# Altium footprint library 1.01-电阻.PcbLib: 82 footprints (part 3 of 6)
Each footprint in its own frame and in the unit in brackets; x right, y up, seen from the top. Pads: shape width x height; smd on the part's side, far side on the other; paste and mask are expansions set on the pad; w line width, h text height; cw(c..) or ccw(c..) is an arc to the next point about the centre after c.
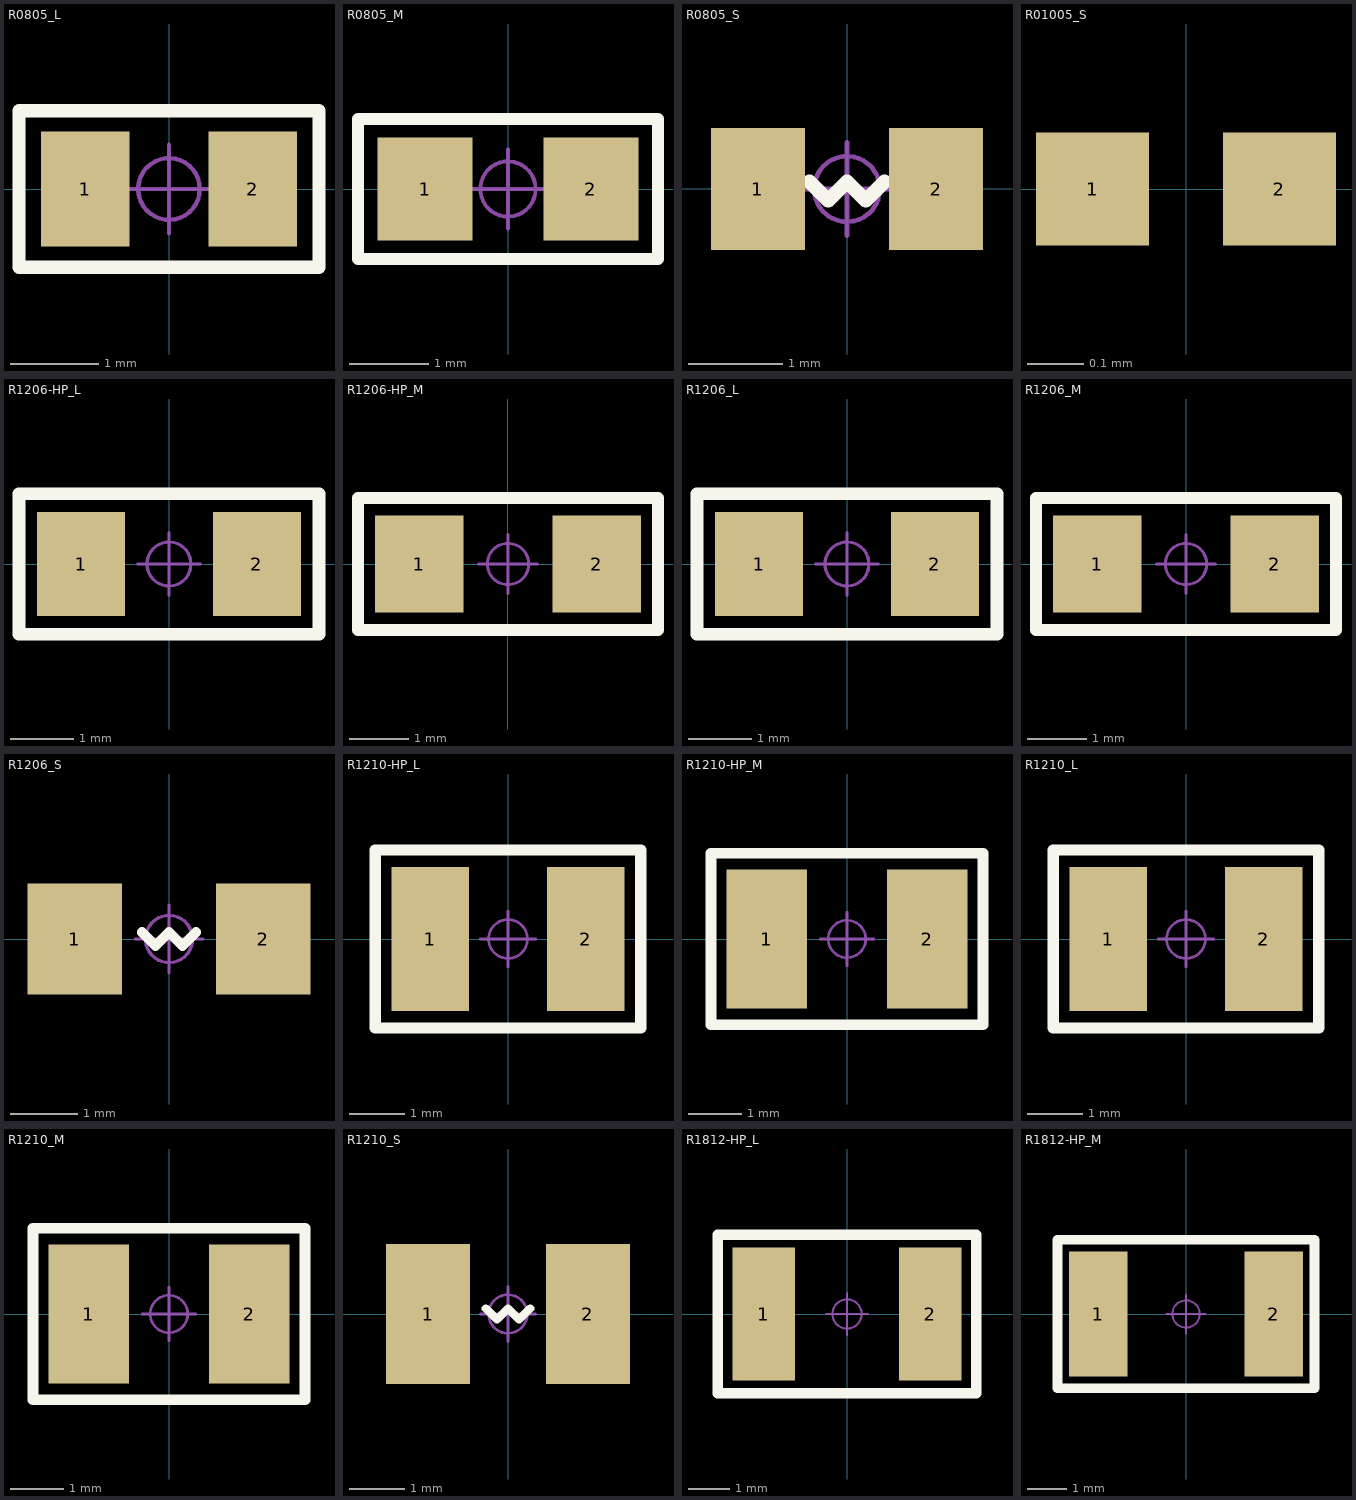
[diagram p2: the footprints below, top view; thin cyan lines are the x and y axes]

## R0805_L [mm] "1/8W贴片电阻"
pads (2):
  rect 1x1.3 smd: 1(-0.95,0) 2(0.95,0)
Top Overlay:
  lines w0.152: -1.702,-0.889 1.702,-0.889 1.702,0.889 -1.702,0.889 -1.702,-0.889
Mechanical 15:
  circle w0.05: c0,0 r0.35
  lines w0.05: -0.5,0 0.5,0 ; 0,-0.5 0,0.5
3D body: height 0.5, standoff 0, extent -1,-0.625 1,0.625

## R0805_M [mm] "1/8W贴片电阻"
pads (2):
  rect 1.2x1.3 smd: 1(-1.05,0) 2(1.05,0)
Top Overlay:
  lines w0.152: -1.9,-0.889 -1.9,0.889 1.9,0.889 1.9,-0.889 -1.9,-0.889
Mechanical 15:
  circle w0.05: c0,0 r0.35
  lines w0.05: -0.5,0 0.5,0 ; 0,-0.5 0,0.5
3D body: height 0.5, standoff 0, extent -1,-0.625 1,0.625

## R0805_S [mm] "1/8W贴片电阻-无丝印      联系卖家 免费人工查找封装"
pads (2):
  rect 1x1.3 smd: 1(-0.95,0) 2(0.95,0)
Top Overlay:
  lines w0.152: -0.4,0.076 -0.2,-0.124 0,0.076 0.2,-0.124 0.4,0.076
Mechanical 15:
  circle w0.05: c0,0 r0.35
  lines w0.05: -0.5,0 0.5,0 ; 0,-0.5 0,0.5
3D body: height 0.5, standoff 0, extent -1,-0.625 1,0.625

## R01005_S [mm] "1/32W贴片电阻-无丝印"
pads (2):
  rect 0.2x0.2 smd paste+0 mask+0: 1(-0.165,0) 2(0.165,0)
3D body: height 0.13, standoff 0, extent -0.199,-0.1 0.199,0.1

## R1206-HP_L [mm] "1/4W高精度贴片电阻"
pads (2):
  rect 1.4x1.65 smd: 1(-1.4,0.006) 2(1.4,0.006)
Top Overlay:
  lines w0.203: -2.388,-1.112 2.388,-1.112 2.388,1.124 -2.388,1.124 -2.388,-1.112
Mechanical 15:
  circle w0.05: c0,0.006 r0.35
  lines w0.05: -0.5,0.006 0.5,0.006 ; 0,-0.494 0,0.506
3D body: height 0.56, standoff 0, extent -1.6,-0.794 1.6,0.806

## R1206-HP_M [mm] "1/4W高精度贴片电阻"
pads (2):
  rect 1.5x1.65 smd: 1(-1.5,0) 2(1.5,0)
Top Overlay:
  lines w0.203: -2.54,-1.118 -2.54,1.118 2.54,1.118 2.54,-1.118 -2.54,-1.118
Mechanical 15:
  circle w0.05: c0,0 r0.35
  lines w0.05: -0.5,0 0.5,0 ; 0,-0.5 0,0.5
3D body: height 0.56, standoff 0, extent -1.6,-0.8 1.6,0.8

## R1206_L [mm] "1/4W贴片电阻"
pads (2):
  rect 1.4x1.65 smd: 1(-1.4,0) 2(1.4,0)
Top Overlay:
  lines w0.203: -2.388,-1.118 2.388,-1.118 2.388,1.118 -2.388,1.118 -2.388,-1.118
Mechanical 15:
  circle w0.05: c0,0 r0.35
  lines w0.05: -0.5,0 0.5,0 ; 0,-0.5 0,0.5
3D body: height 0.56, standoff 0, extent -1.6,-0.8 1.6,0.8

## R1206_M [mm] "1/4W贴片电阻"
pads (2):
  rect 1.5x1.65 smd: 1(-1.5,0) 2(1.5,0)
Top Overlay:
  lines w0.203: -2.54,-1.118 -2.54,1.118 2.54,1.118 2.54,-1.118 -2.54,-1.118
Mechanical 15:
  circle w0.05: c0,0 r0.35
  lines w0.05: -0.5,0 0.5,0 ; 0,-0.5 0,0.5
3D body: height 0.56, standoff 0, extent -1.6,-0.8 1.6,0.8

## R1206_S [mm] "1/4W贴片电阻-无丝印      联系卖家 免费人工查找封装"
pads (2):
  rect 1.4x1.65 smd: 1(-1.4,0) 2(1.4,0)
Top Overlay:
  lines w0.152: -0.4,0.1 -0.2,-0.1 0,0.1 0.2,-0.1 0.4,0.1
Mechanical 15:
  circle w0.05: c0,0 r0.35
  lines w0.05: -0.5,0 0.5,0 ; 0,-0.5 0,0.5
3D body: height 0.56, standoff 0, extent -1.6,-0.8 1.6,0.8

## R1210-HP_L [mm] "1/3W高精度贴片电阻           联系卖家 免费查找封装"
pads (2):
  rect 1.4x2.6 smd: 1(-1.4,0) 2(1.4,0)
Top Overlay:
  lines w0.203: -2.388,-1.6 -2.388,1.6 2.388,1.6 2.388,-1.6 -2.388,-1.6
Mechanical 15:
  circle w0.05: c0,0 r0.35
  lines w0.05: -0.5,0 0.5,0 ; 0,-0.5 0,0.5
3D body: height 0.56, standoff 0, extent -1.6,-1.25 1.6,1.25

## R1210-HP_M [mm] "1/3W高精度贴片电阻             联系卖家 免费查找封装"
pads (2):
  rect 1.5x2.6 smd: 1(-1.5,0) 2(1.5,0)
Top Overlay:
  lines w0.203: -2.54,-1.6 -2.54,1.6 2.54,1.6 2.54,-1.6 -2.54,-1.6
Mechanical 15:
  circle w0.05: c0,0 r0.35
  lines w0.05: -0.5,0 0.5,0 ; 0,-0.5 0,0.5
3D body: height 0.56, standoff 0, extent -1.6,-1.225 1.6,1.275

## R1210_L [mm] "1/3W贴片电阻"
pads (2):
  rect 1.4x2.6 smd: 1(-1.4,0) 2(1.4,0)
Top Overlay:
  lines w0.203: -2.388,-1.6 2.388,-1.6 2.388,1.6 -2.388,1.6 -2.388,-1.6
Mechanical 15:
  circle w0.05: c0,0 r0.35
  lines w0.05: -0.5,0 0.5,0 ; 0,-0.5 0,0.5
3D body: height 0.56, standoff 0, extent -1.6,-1.25 1.6,1.25

## R1210_M [mm] "1/3W贴片电阻            联系卖家 免费查找封装"
pads (2):
  rect 1.5x2.6 smd: 1(-1.5,0) 2(1.5,0)
Top Overlay:
  lines w0.203: -2.54,-1.6 -2.54,1.6 2.54,1.6 2.54,-1.6 -2.54,-1.6
Mechanical 15:
  circle w0.05: c0,0 r0.35
  lines w0.05: -0.5,0 0.5,0 ; 0,-0.5 0,0.5
3D body: height 0.56, standoff 0, extent -1.6,-1.25 1.6,1.25

## R1210_S [mm] "1/3W贴片电阻      联系卖家 免费人工查找封装"
pads (2):
  rect 1.524x2.54 smd: 1(-1.45,0) 2(1.45,0)
Top Overlay:
  lines w0.152: -0.4,0.1 -0.2,-0.1 0,0.1 0.2,-0.1 0.4,0.1
Mechanical 15:
  circle w0.05: c0,0 r0.35
  lines w0.05: -0.5,0 0.5,0 ; 0,-0.5 0,0.5
3D body: height 0.56, standoff 0, extent -1.6,-1.25 1.6,1.25

## R1812-HP_L [mm] "1/2W高精度贴片电阻            联系卖家 免费查找封装"
pads (2):
  rect 1.5x3.2 smd: 1(-2,0) 2(2,0)
Top Overlay:
  lines w0.254: -1.27,1.905 1.016,1.905 3.1,1.905 3.1,-1.905 1.016,-1.905 -1.016,-1.905 -3.1,-1.905 -3.1,1.905 -1.016,1.905
Mechanical 15:
  circle w0.05: c0,0 r0.35
  lines w0.05: -0.5,0 0.5,0 ; 0,-0.5 0,0.5
3D body: height 0.56, standoff 0, extent -2.25,-1.6 2.25,1.6

## R1812-HP_M [mm] "1/2W高精度贴片电阻            联系卖家 免费查找封装"
pads (2):
  rect 1.5x3.2 smd: 1(-2.25,0) 2(2.25,0)
Top Overlay:
  lines w0.254: -1.27,1.905 1.016,1.905 3.302,1.905 3.302,-0.508 3.302,-1.905 1.016,-1.905 -1.016,-1.905 -3.302,-1.905 -3.302,1.905 -1.016,1.905
Mechanical 15:
  circle w0.05: c0,0 r0.35
  lines w0.05: -0.5,0 0.5,0 ; 0,-0.5 0,0.5
3D body: height 0.56, standoff 0, extent -2.25,-1.6 2.25,1.6